# Altium footprint library pcb.PcbLib: 397 footprints (part 25 of 25)
Each footprint in its own frame and in the unit in brackets; x right, y up, seen from the top. Pads: shape width x height; smd on the part's side, far side on the other; paste and mask are expansions set on the pad; w line width, h text height; cw(c..) or ccw(c..) is an arc to the next point about the centre after c.
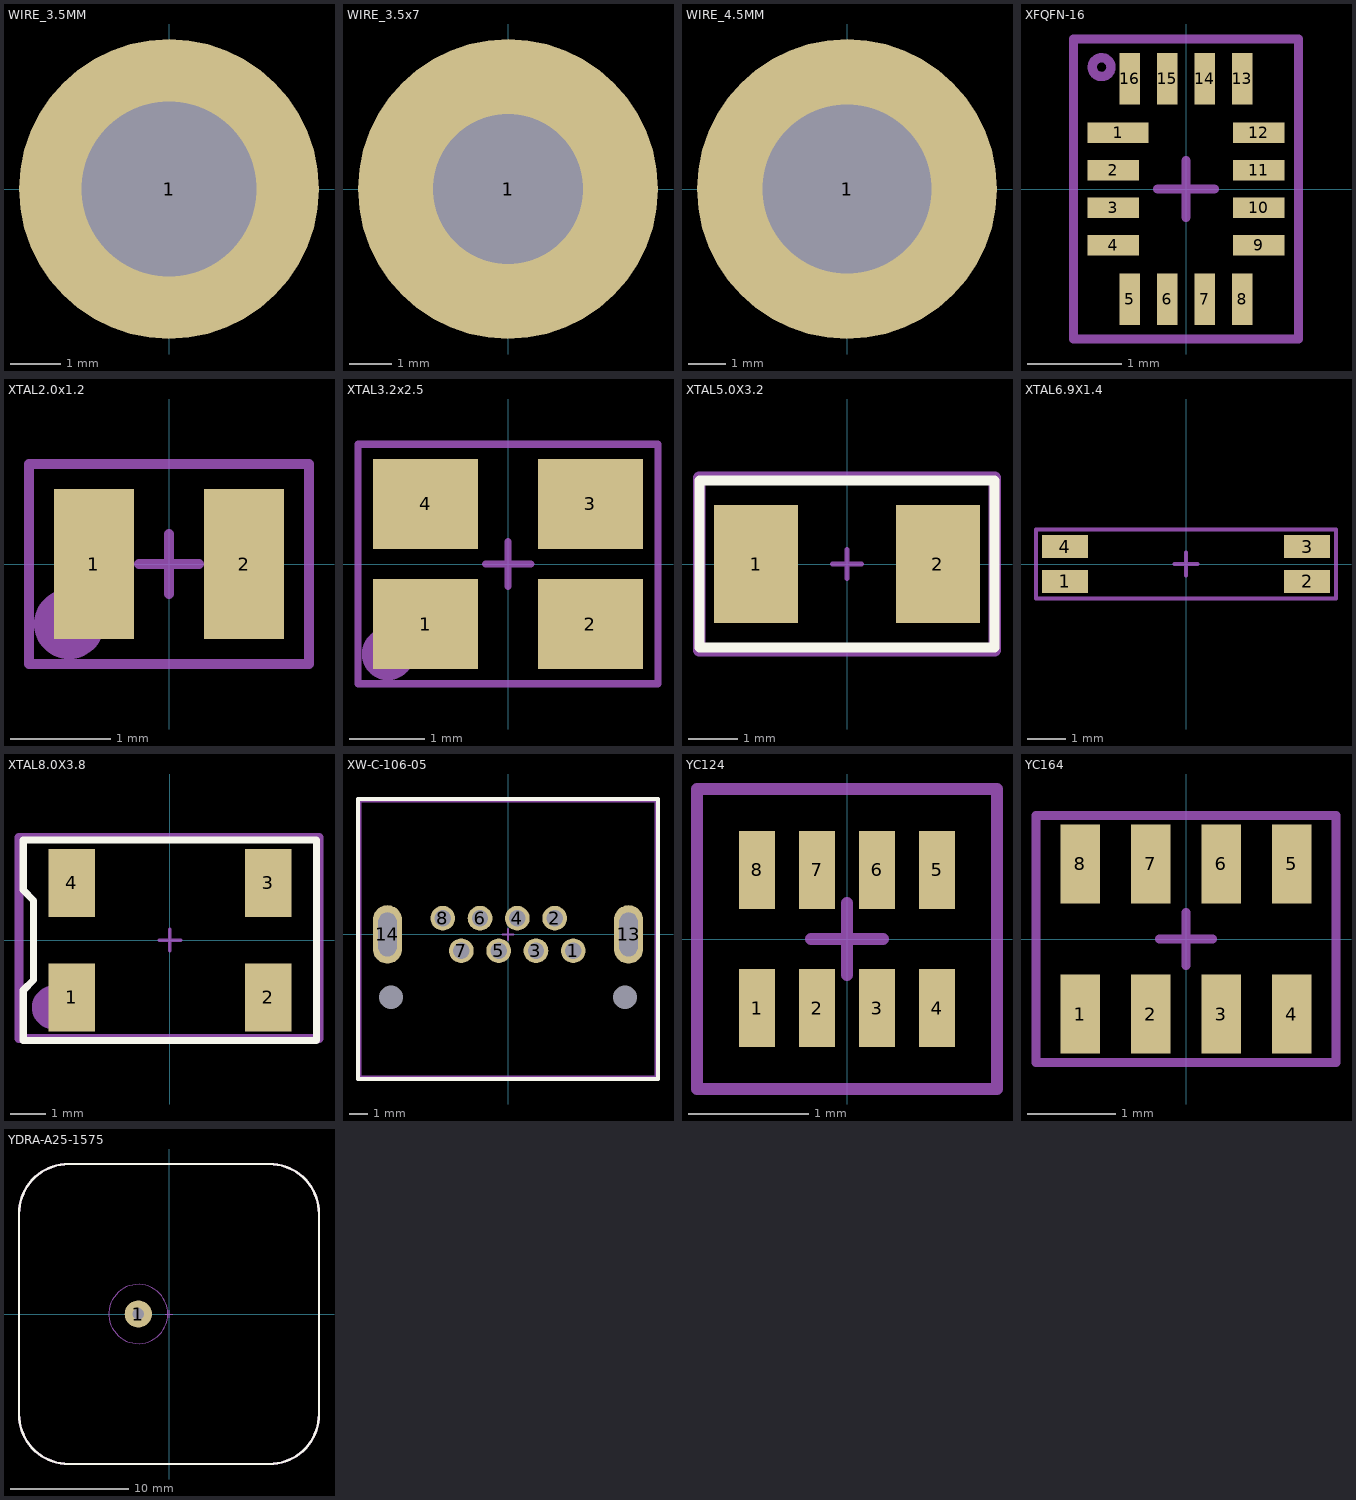
[diagram p24: the footprints below, top view; thin cyan lines are the x and y axes]

## WIRE_3.5MM [mm]
pads (1):
  round 6 hole 3.5: 1(0,0)

## WIRE_3.5x7 [mm]
pads (1):
  round 7 hole 3.5: 1(0,0)

## WIRE_4.5MM [mm]
pads (1):
  round 8 hole 4.5: 1(0,0)

## XFQFN-16 [mm]
pads (16):
  rect 0.65x0.22 smd paste-0.02 mask+0.125: 1(-0.725,0.6)
  rect 0.55x0.22 smd paste-0.02 mask+0.125: 2(-0.775,0.2) 3(-0.775,-0.2) 4(-0.775,-0.6) 9(0.775,-0.6) 10(0.775,-0.2) 11(0.775,0.2) 12(0.775,0.6)
  rect 0.22x0.55 smd paste-0.02 mask+0.125: 5(-0.6,-1.175) 6(-0.2,-1.175) 7(0.2,-1.175) 8(0.6,-1.175) 13(0.6,1.175) 14(0.2,1.175) 15(-0.2,1.175) 16(-0.6,1.175)
Mechanical 15:
  circle w0.1: c-0.9,1.3 r0.1
  lines w0.1: -0.3,0 0.3,0 ; 0,-0.3 0,0.3 ; -1.2,-1.6 -1.2,1.6 1.2,1.6 1.2,-1.6 -1.2,-1.6
  text ".Designator" at -0.9,-1.4 h1.02
3D body: height 0.8, standoff 0, extent -1.05,-1.45 1.05,1.45

## XTAL2.0x1.2 [mm]
height 0.6
pads (2):
  rect 0.8x1.5 smd: 1(-0.75,0) 2(0.75,0)
Mechanical 15:
  circle w0.5: c-1,-0.6 r0.1
  lines w0.1: -0.3,0 0.3,0 ; 0,-0.3 0,0.3 ; -1.4,-1 1.4,-1 1.4,1 -1.4,1 -1.4,-1
  text ".Designator" at -1.2,-0.1 h1.02
3D body: height 0.6, standoff 0, extent -1,-0.6 1,0.6

## XTAL3.2x2.5 [mm]
height 0.55
pads (4):
  rect 1.4x1.2 smd: 1(-1.1,-0.8) 2(1.1,-0.8) 3(1.1,0.8) 4(-1.1,0.8)
Mechanical 15:
  circle w0.5: c-1.6,-1.2 r0.1
  lines w0.1: -0.3,0 0.3,0 ; 0,-0.3 0,0.3 ; -2,-1.6 -2,1.6 2,1.6 2,-1.6 -2,-1.6
  text ".Designator" at -1.8,0.3 h1.02
3D body: height 3, standoff 0, extent -1.6,-1.3 1.6,1.3

## XTAL5.0X3.2 [mm]
height 1
pads (2):
  rect 1.7x2.4 smd: 1(-1.85,0) 2(1.85,0)
Top Overlay:
  lines w0.2: -3,-1.7 -3,1.7 3,1.7 3,-1.7 -3,-1.7
Mechanical 15:
  lines w0.1: -0.3,0 0.3,0 ; 0,-0.3 0,0.3
  lines w0.254: -3,-1.75 3,-1.75 3,1.75 -3,1.75 -3,-1.75
  text ".Designator" at -2.25,-1.25 h1.02
3D body: height 1.35, standoff 0, extent -2.5,-1.6 2.5,1.6

## XTAL6.9X1.4 [mm]
height 1.4
pads (4):
  rect 1.2x0.6 smd: 1(-3.15,-0.45) 2(3.15,-0.45) 3(3.15,0.45) 4(-3.15,0.45)
Mechanical 15:
  circle w0.1: c-3.25,-0.45 r0.1
  lines w0.1: -0.3,0 0.3,0 ; 0,-0.3 0,0.3 ; -3.9,-0.9 3.9,-0.9 3.9,0.9 -3.9,0.9 -3.9,-0.9
  text ".Designator" at -2.7,-0.55 h1.02
3D body: height 1.3, standoff 0, extent -3.45,-0.7 3.45,0.7

## XTAL8.0X3.8 [mm]
height 2.5
pads (4):
  rect 1.3x1.9 smd: 1(-2.75,-1.6) 2(2.75,-1.6) 3(2.75,1.6) 4(-2.75,1.6)
Top Overlay:
  lines w0.2: -4.1,-2.8 -4.1,-1.4 -3.81,-1.11 -3.81,1.11 -4.1,1.4 -4.1,2.8 4.1,2.8 4.1,-2.8 -4.1,-2.8
Mechanical 15:
  circle w1.016: c-3.25,-1.88 r0.1
  lines w0.1: -0.3,0 0.3,0 ; 0,-0.3 0,0.3
  lines w0.254: -4.218,-2.743 4.166,-2.743 4.166,2.866 -4.218,2.866 -4.218,-2.743
  text ".Designator" at -2.332,-1.798 h1.02
3D body: height 3, standoff 0, extent -4,-1.9 4,1.9

## XW-C-106-05 [mm]
height 11.5
pads (12):
  round 1.35 hole 0.89: 1(3.57,-0.89) 2(2.55,0.89) 3(1.53,-0.89) 4(0.51,0.89) 5(-0.51,-0.89) 6(-1.53,0.89) 7(-2.55,-0.89) 8(-3.57,0.89)
  oval 1.6x3.2 hole 1 slot 2.4 at 90 deg: 13(6.59,0) 14(-6.59,0)
  round 0 hole 1.3 unplated: ""(-6.4,-3.43) ""(6.4,-3.43)
Top Overlay:
  lines w0.2: -8.2,-7.9 8.2,-7.9 8.2,7.4 -8.2,7.4 -8.2,-7.9
Mechanical 15:
  lines w0.1: -0.3,0 0.3,0 ; 0,-0.3 0,0.3
  lines w0.2: -8.1,-7.8 -8.1,7.3 8.1,7.3 8.1,-7.8 -8.1,-7.8
  text ".Designator" at -5,-6.6 h1.02
3D body: height 11.5, standoff 0, extent -8.1,-7.8 8.1,7.2

## YC124 [mm]
height 1
pads (8):
  rect 0.3x0.65 smd paste-0.03: 1(-0.75,-0.575) 2(-0.25,-0.575) 3(0.25,-0.575) 4(0.75,-0.575) 5(0.75,0.575) 6(0.25,0.575) 7(-0.25,0.575) 8(-0.75,0.575)
Mechanical 15:
  lines w0.1: -0.3,0 0.3,0 ; 0,-0.3 0,0.3 ; -1.25,-1.25 1.25,-1.25 1.25,1.25 -1.25,1.25 -1.25,-1.25
  text ".Designator" at -1,-1 h0.51
3D body: height 0.45, standoff 0, extent -1,-0.5 1,0.5

## YC164 [mm]
height 1
pads (8):
  rect 0.45x0.9 smd paste-0.03: 1(-1.2,-0.85) 2(-0.4,-0.85) 3(0.4,-0.85) 4(1.2,-0.85) 5(1.2,0.85) 6(0.4,0.85) 7(-0.4,0.85) 8(-1.2,0.85)
Mechanical 15:
  lines w0.1: -0.3,0 0.3,0 ; 0,-0.3 0,0.3 ; -1.7,-1.4 1.7,-1.4 1.7,1.4 -1.7,1.4 -1.7,-1.4
  text ".Designator" at -1.35,-1.2 h0.51
3D body: height 0.45, standoff 0, extent -1.6,-0.8 1.6,0.8

## YDRA-A25-1575 [mm]
height 4
pads (1):
  round 2.3 hole 1: 1(-2.6,0)
Top Overlay:
  lines w0.2: -12.7,-8.5 ccw(c-8.5,-8.5) -8.5,-12.7 8.5,-12.7 ccw(c8.5,-8.5) 12.7,-8.5 12.7,8.5 ccw(c8.5,8.5) 8.5,12.7 -8.5,12.7 ccw(c-8.5,8.5) -12.7,8.5 -12.7,-8.5
Mechanical 15:
  lines w0.1: -0.3,0 0.3,0 ; 0,-0.3 0,0.3
  lines w0.2: -12.7,-8.5 ccw(c-8.5,-8.5) -8.5,-12.7 8.5,-12.7 ccw(c8.5,-8.5) 12.7,-8.5 12.7,8.5 ccw(c8.5,8.5) 8.5,12.7 -8.5,12.7 ccw(c-8.5,8.5) -12.7,8.5 -12.7,-8.5
  text ".Designator" at -9,-10 h1.02
Mechanical 16:
  circle w0.1: c-2.6,0 r2.5
3D body "patch25x25x4.stp": height 4, standoff 0, extent -12.5,-12.5 12.5,12.5